# Altium footprint library 2.52-直插元件.PcbLib: 163 footprints (part 1 of 11)
Each footprint in its own frame and in the unit in brackets; x right, y up, seen from the top. Pads: shape width x height; smd on the part's side, far side on the other; paste and mask are expansions set on the pad; w line width, h text height; cw(c..) or ccw(c..) is an arc to the next point about the centre after c.
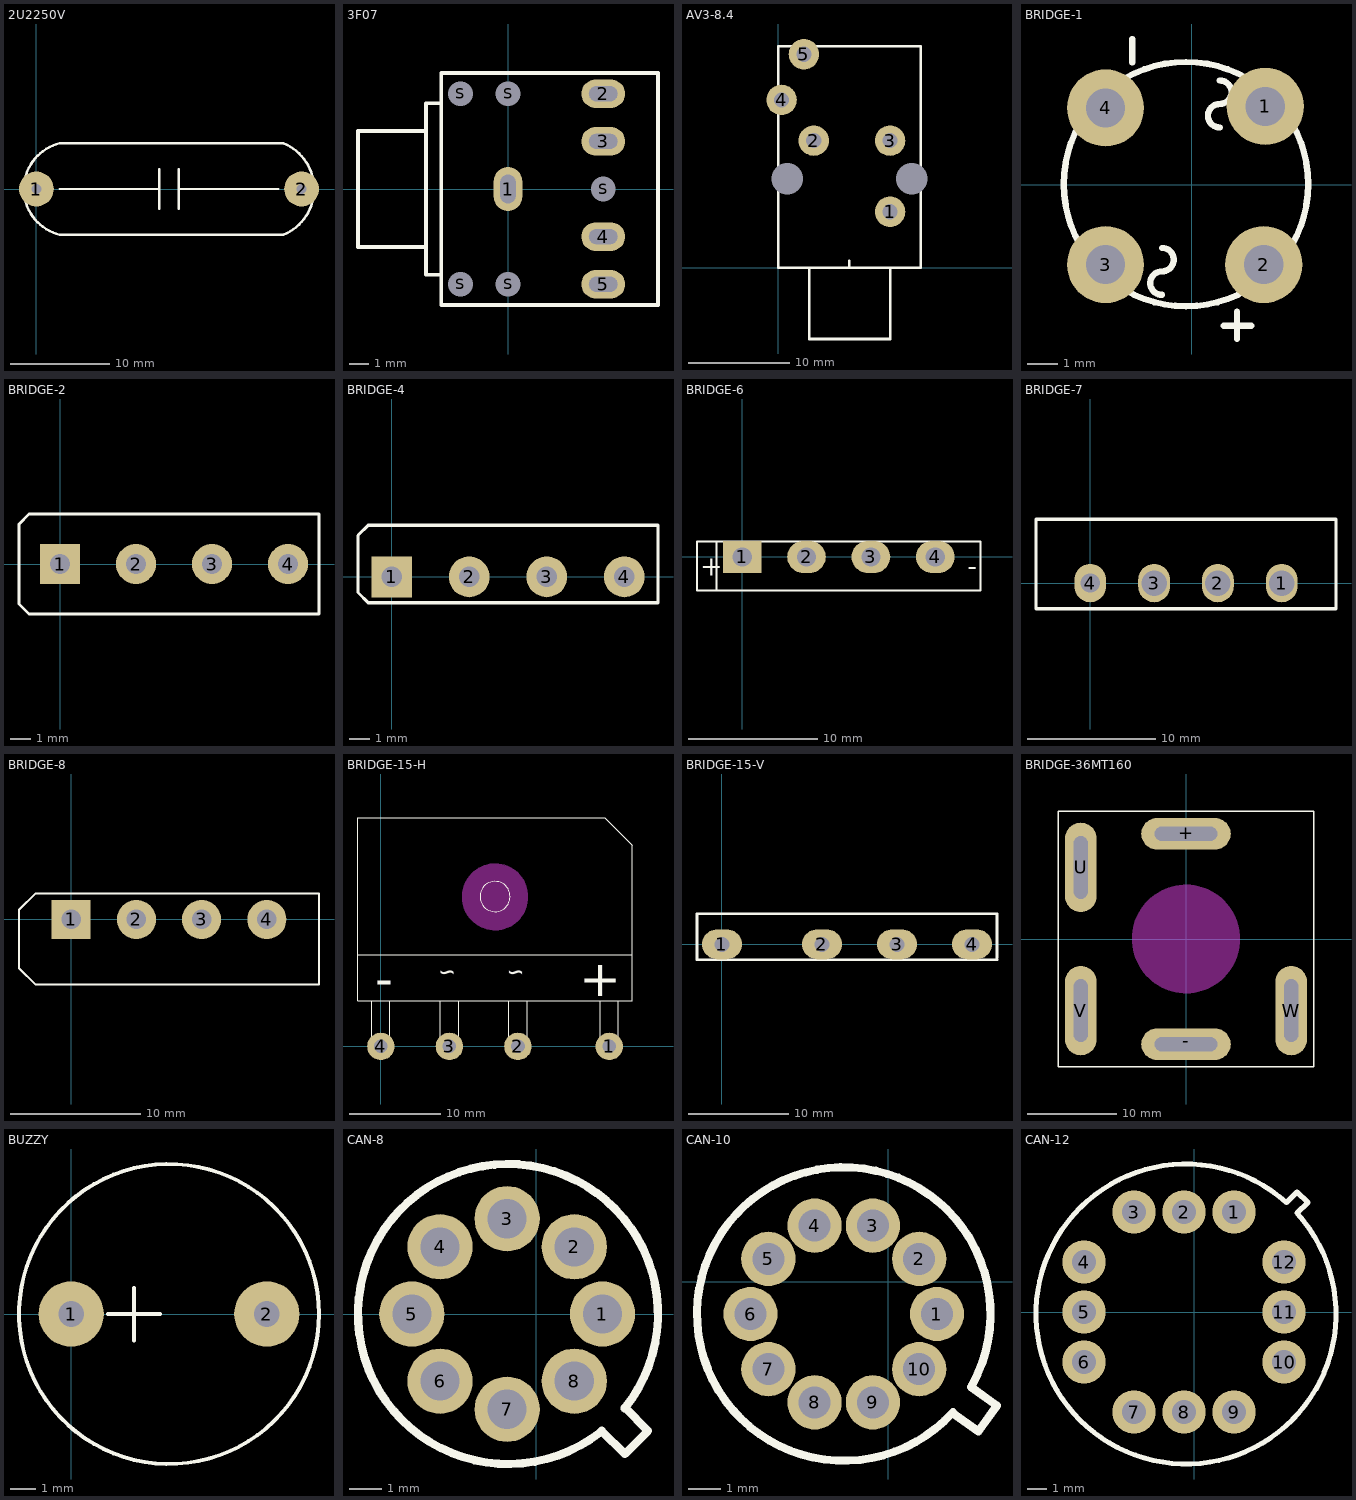
[diagram p0: the footprints below, top view; thin cyan lines are the x and y axes]

## 2U2250V [mm]
pads (2):
  round 3.5 hole 1: 1(0,0) 2(26.67,0)
Top Overlay:
  lines w0.25: 2.335,0 12.335,0 ; 12.335,-2 12.335,2 ; 14.335,-2 14.335,2 ; 14.335,0 24.335,0 ; 2.335,-4.6 cw(c3.474,0) 2.335,4.6 24.835,4.6 cw(c22.974,0) 24.835,-4.6 2.335,-4.6

## 3F07 [mm] "立体声耳机插座"
pads (10):
  oval 1.5x2.3 hole 0.8 slot 1.5 at 90 deg: 1(0,0)
  oval 2.3x1.5 hole 0.8 slot 1.5 at 0 deg: 2(5,5) 3(5,2.5) 4(5,-2.5) 5(5,-5)
  round 1 hole 1.3: S(-2.5,-5) S(-2.5,5) S(0,-5) S(0,5) S(5,0)
Top Overlay:
  lines w0.2: -4.318,-3.048 -7.874,-3.048 -7.874,3.048 -4.318,3.048 ; -3.5,-4.5 -4.3,-4.5 -4.3,4.5 -3.5,4.5 ; -3.5,-6.096 7.874,-6.096 7.874,6.096 -3.5,6.096 -3.5,0 -3.5,-6.096
3D body: height 6, standoff 0, extent -7.874,-3.048 -4.318,3.048
3D body: height 6, standoff 0, extent -4.318,-4.445 -3.429,4.445
3D body: height 6, standoff 0, extent -3.429,-5.969 7.874,5.969

## AV3-8.4 [mm]
pads (7):
  round 3 hole 1.5: 1(11,5.5) 2(3.5,12.5) 3(11,12.5) 4(0.325,16.5) 5(2.525,21)
  round 3 hole 3.1 unplated: ""(0.9,8.75) ""(13.15,8.75)
Top Overlay:
  lines w0.254: 3.04,0 3.04,-7.02 11.02,-7.02 11.02,0 ; 7,0 7,0.66 ; 0,0 0,21.8 14,21.8 14,0 0,0
3D body "User Library-Mouser_161-4320.STEP": height 40.92, standoff -4.32, extent 0.3,-8.208 17.115,23.008

## BRIDGE-1 [mm] "淘宝ID:黄晶宝石   店铺网址:https://shop463601444.taobao.com"
pads (4):
  round 2.5 hole 1.27: 1(2.388,2.54) 2(2.337,-2.591) 3(-2.794,-2.591) 4(-2.794,2.489)
Top Overlay:
  circle w0.203: c-0.184,0.018 r3.962
  lines w0.203: -1.93,3.962 -1.93,4.724 ; -0.963,-3.573 cw(c-0.963,-3.192) -0.963,-2.811 ccw(c-0.963,-2.43) -0.963,-2.049 ; 0.91,1.856 cw(c0.91,2.237) 0.91,2.618 ccw(c0.91,2.999) 0.91,3.38 ; 1.041,-4.572 1.93,-4.572 ; 1.473,-5.004 1.473,-4.115
3D body "User Library-Silicon Bridge Rectifiers 2W10.STEP": height 7.62, standoff -10.38, extent -4.724,-4.449 4.276,4.551

## BRIDGE-2 [mm] "淘宝ID:黄晶宝石   店铺网址:https://shop463601444.taobao.com"
pads (4):
  rect 2x2 hole 1: 1(0,0)
  round 2 hole 1: 2(3.8,0) 3(7.6,0) 4(11.4,0)
Top Overlay:
  lines w0.15: -2.053,-1.997 -1.55,-2.5 12.95,-2.5 12.95,2.5 -1.55,2.5 -2.047,2.003 -2.053,2.003 -2.053,-1.997 ; -2.053,-1.997 -2.053,-1.997
3D body "User Library-3N246.step": height 12.59, standoff -13.79, extent -1.477,-2.419 13.243,2.425

## BRIDGE-4 [mm] "淘宝ID:黄晶宝石   店铺网址:https://shop463601444.taobao.com"
pads (4):
  rect 2x2 hole 1: 1(0,0)
  round 2 hole 1: 2(3.8,0) 3(7.6,0) 4(11.4,0)
Top Overlay:
  lines w0.15: -1.65,-0.767 -1.147,-1.27 13.05,-1.27 13.05,2.53 -1.153,2.53 -1.65,2.033 -1.65,-0.767
3D body "零?": height 12.09, standoff -4.09, extent -1.665,-1.27 13.065,2.53

## BRIDGE-6 [mm] "淘宝ID:黄晶宝石   店铺网址:https://shop463601444.taobao.com"
pads (4):
  rect 3x2.5 hole 1.5: 1(0,0)
  oval 3x2.5 hole 1.5: 2(5,0) 3(10,0) 4(15,0)
Top Overlay:
  lines w0.15: -2,-2.6 -2,1.2 ; -3.5,-2.6 18.5,-2.6 18.5,1.2 -3.5,1.2 -3.5,-2.6
  text "+" at -3.261,-1.462 h1.52
  text "-" at 18.261,-1.462 h1.52
3D body "User Library-bridge 2.step": height 21, standoff -15.63, extent -3.65,-2.58 18.65,1.18

## BRIDGE-7 [mm] "淘宝ID:黄晶宝石   店铺网址:https://shop463601444.taobao.com"
pads (4):
  oval 2.5x3 hole 2: 1(15.001,0) 2(10,0) 3(5.001,0)
  oval 2.5x3 hole 1.5: 4(0,0)
Top Overlay:
  lines w0.254: -4.25,-2 -4.25,5 19.25,5 19.25,-2 -4.25,-2
3D body "User Library-bridge-9528.step": height 10.75, standoff -9.75, extent -2.509,-1.347 18.291,2.153

## BRIDGE-8 [mm] "淘宝ID:黄晶宝石   店铺网址:https://shop463601444.taobao.com"
pads (4):
  rect 3x3 hole 1.5: 1(0,0)
  round 3 hole 1.5: 2(5,0) 3(10,0) 4(15,0)
Top Overlay:
  lines w0.15: -2.725,-5.001 -4,-3.726 -4,0.725 -2.725,2 19,2 19,-5 -2.725,-5
3D body "User Library-KBU1010.step": height 19.74, standoff -27.96, extent -4.318,-5.069 19.396,2.032

## BRIDGE-15-H [mm]
pads (4):
  round 3 hole 1.5: 1(25,0) 2(15,0) 3(7.5,0) 4(0,0)
Top Overlay:
  circle w0.1: c12.5,16.4 r1.65
  lines w0.1: -2.5,10 27.5,10 ; -1,5 -1,1 -0.5,0.5 0.5,0.5 1,1 1,5 ; 6.5,5 6.5,1 7,0.5 8,0.5 8.5,1 8.5,5 ; 14,5 14,1 14.5,0.5 15.5,0.5 16,1 16,5 ; 24,5 24,1 24.5,0.5 25.5,0.5 26,1 26,5 ; 24.5,25 27.5,22 27.5,5 -2.5,5 -2.5,25 24.5,25 ; 24.5,25 24.5,25
  text "～" at 8.833,6.18 h4
  text "+" at 26.333,5.501 h4
  text "～" at 16.333,6.18 h4
  text "-" at 1.333,5.501 h4
Keep-Out Layer:
  board cut-out: 8.9,16.363 8.9,16.598 8.962,17.064 9.083,17.519 9.263,17.954 9.499,18.361 9.785,18.734 10.118,19.067 10.491,19.353 10.899,19.589 11.333,19.769 11.788,19.89 12.254,19.952 12.489,19.952 12.51,19.952 12.745,19.952 13.212,19.89 13.667,19.769 14.101,19.589 14.509,19.353 14.882,19.067 15.215,18.734 15.501,18.361 15.737,17.953 15.917,17.518 16.039,17.064 16.1,16.597 16.1,16.362 16.1,16.126 16.038,15.658 15.916,15.202 15.736,14.766 15.5,14.358 15.213,13.983 14.879,13.649 14.504,13.362 14.096,13.126 13.66,12.946 13.204,12.823 12.736,12.762 12.5,12.762 12.48,12.762 12.245,12.762 11.78,12.823 11.327,12.945 10.893,13.124 10.487,13.359 10.115,13.644 9.783,13.976 9.497,14.349 9.263,14.755 9.083,15.189 8.962,15.642 8.9,16.107 8.9,16.342
Keep-Out Layer:
  circle w0.1: c12.5,16.357 r3.6
3D body "bridge-15A-V.STEP": height 10, standoff -4.15, extent -2.5,-0.347 27.5,26.403

## BRIDGE-15-V [mm]
pads (4):
  oval 4x3 hole 1.5: 1(0,0) 2(10,0) 3(17.5,0) 4(25,0)
Top Overlay:
  lines w0.254: 27.5,-1.55 -2.5,-1.55 -2.5,3.05 27.5,3.05 27.5,-1.35
3D body "User Library-bridge-irxb25.STEP": height 24, standoff -13.5, extent -2.5,-1.55 27.5,3.05

## BRIDGE-36MT160 [mm]
pads (5):
  oval 10x3.5 hole 1.6 slot 7 at 0 deg: +(0,11.75) -(0,-11.75)
  oval 3.5x10 hole 1.6 slot 7 at 90 deg: U(-11.75,7.989) V(-11.75,-7.989) W(11.75,-7.989)
Top Overlay:
  lines w0.15: -14.25,-14.25 14.25,-14.25 14.25,14.25 -14.25,14.25 -14.25,-14.25
Keep-Out Layer:
  board cut-out: 6.001,0.006 6.001,0.3 5.943,0.887 5.828,1.464 5.657,2.028 5.432,2.572 5.154,3.092 4.827,3.581 4.453,4.037 4.037,4.453 3.582,4.827 3.092,5.154 2.572,5.432 2.028,5.657 1.465,5.828 0.887,5.943 0.301,6.001 0.006,6.001 -0.103,6.001 -0.489,6.001 -1.255,5.9 -2.002,5.7 -2.716,5.404 -3.385,5.018 -3.998,4.548 -4.545,4.001 -5.015,3.388 -5.401,2.719 -5.697,2.005 -5.897,1.258 -5.998,0.492 -5.998,0.106 -5.998,0.006 -5.998,-0.289 -5.94,-0.877 -5.825,-1.456 -5.653,-2.021 -5.427,-2.567 -5.149,-3.088 -4.821,-3.579 -4.446,-4.035 -4.029,-4.453 -3.572,-4.827 -3.081,-5.155 -2.561,-5.434 -2.015,-5.66 -1.45,-5.831 -0.871,-5.946 -0.283,-6.004 0.012,-6.004 0.017,-6.004 0.311,-6.004 0.896,-5.946 1.473,-5.832 2.035,-5.661 2.579,-5.436 3.097,-5.159 3.586,-4.832 4.041,-4.459 4.456,-4.044 4.829,-3.589 5.156,-3.1 5.433,-2.582 5.658,-2.038 5.829,-1.476 5.943,-0.899 6.001,-0.314 6.001,-0.02
Keep-Out Layer:
  circle w0.1: c0,0 r6
Mechanical 1:
  lines w0.1: -12.55,-10.989 ccw(c-11.75,-10.989) -10.95,-10.989 -10.95,-4.989 ccw(c-11.75,-4.989) -12.55,-4.989 -12.55,-10.989 ; -12.55,4.989 ccw(c-11.75,4.989) -10.95,4.989 -10.95,10.989 ccw(c-11.75,10.989) -12.55,10.989 -12.55,4.989 ; -3,-12.55 cw(c-3,-11.75) -3,-10.95 3,-10.95 cw(c3,-11.75) 3,-12.55 -3,-12.55 ; -3,10.95 cw(c-3,11.75) -3,12.55 3,12.55 cw(c3,11.75) 3,10.95 -3,10.95 ; 10.95,-10.989 ccw(c11.75,-10.989) 12.55,-10.989 12.55,-4.989 ccw(c11.75,-4.989) 10.95,-4.989 10.95,-10.989
3D body "User Library-36MT160-1.STEP": height 10.5, standoff -10.5, extent -14.25,-14.25 14.25,14.25

## BUZZY [mm]
pads (2):
  round 2.54 hole 1: 1(0,0) 2(7.62,0)
Top Overlay:
  circle w0.15: c3.81,0 r5.842
  lines w0.15: 1.424,0 3.464,0 ; 2.45,-1.026 2.45,1.014
3D body "User Library-Kobitone_Buzzer.step": height 7.38, standoff -5.7, extent -2.108,-5.918 9.728,5.918

## CAN-8 [mm] "淘宝ID:黄晶宝石"
pads (8):
  round 2 hole 1.2: 1(2.032,0) 2(1.168,2.057) 3(-0.889,2.921) 4(-2.946,2.057) 5(-3.81,0) 6(-2.946,-2.057) 7(-0.889,-2.921) 8(1.168,-2.057)
Top Overlay:
  lines w0.254: 1.967,-3.623 cw(c-0.864,0) 2.709,-2.893 ; 2.007,-3.581 2.718,-4.293 3.429,-3.581 2.718,-2.87

## CAN-10 [mm] "淘宝ID:黄晶宝石"
pads (10):
  round 1.7 hole 1: 1(1.524,-1.016) 2(0.965,0.711) 3(-0.483,1.753) 4(-2.311,1.753) 5(-3.759,0.711) 6(-4.318,-1.016) 7(-3.759,-2.743) 8(-2.311,-3.785) 9(-0.483,-3.785) 10(0.965,-2.743)
Top Overlay:
  lines w0.254: 2.007,-4.115 2.819,-4.699 3.404,-3.886 2.591,-3.302 ; 2.02,-4.092 cw(c-1.397,-1.016) 2.624,-3.245

## CAN-12 [mm] "淘宝ID:黄晶宝石"
pads (12):
  round 2.2 hole 1.2: 1(2.032,5.08) 2(-0.508,5.08) 3(-3.048,5.08) 4(-5.588,2.54) 5(-5.588,0) 6(-5.588,-2.54) 7(-3.048,-5.08) 8(-0.508,-5.08) 9(2.032,-5.08) 10(4.572,-2.54) 11(4.572,0) 12(4.572,2.54)
Top Overlay:
  lines w0.254: 4.692,5.561 ccw(c-0.406,-0.102) 5.256,4.997 ; 4.699,5.563 5.232,6.096 5.791,5.563 5.232,5.029